# Altium footprint library Power_Lib_Altium.PcbLib: 383 footprints (part 7 of 24)
Each footprint in its own frame and in the unit in brackets; x right, y up, seen from the top. Pads: shape width x height; smd on the part's side, far side on the other; paste and mask are expansions set on the pad; w line width, h text height; cw(c..) or ccw(c..) is an arc to the next point about the centre after c.
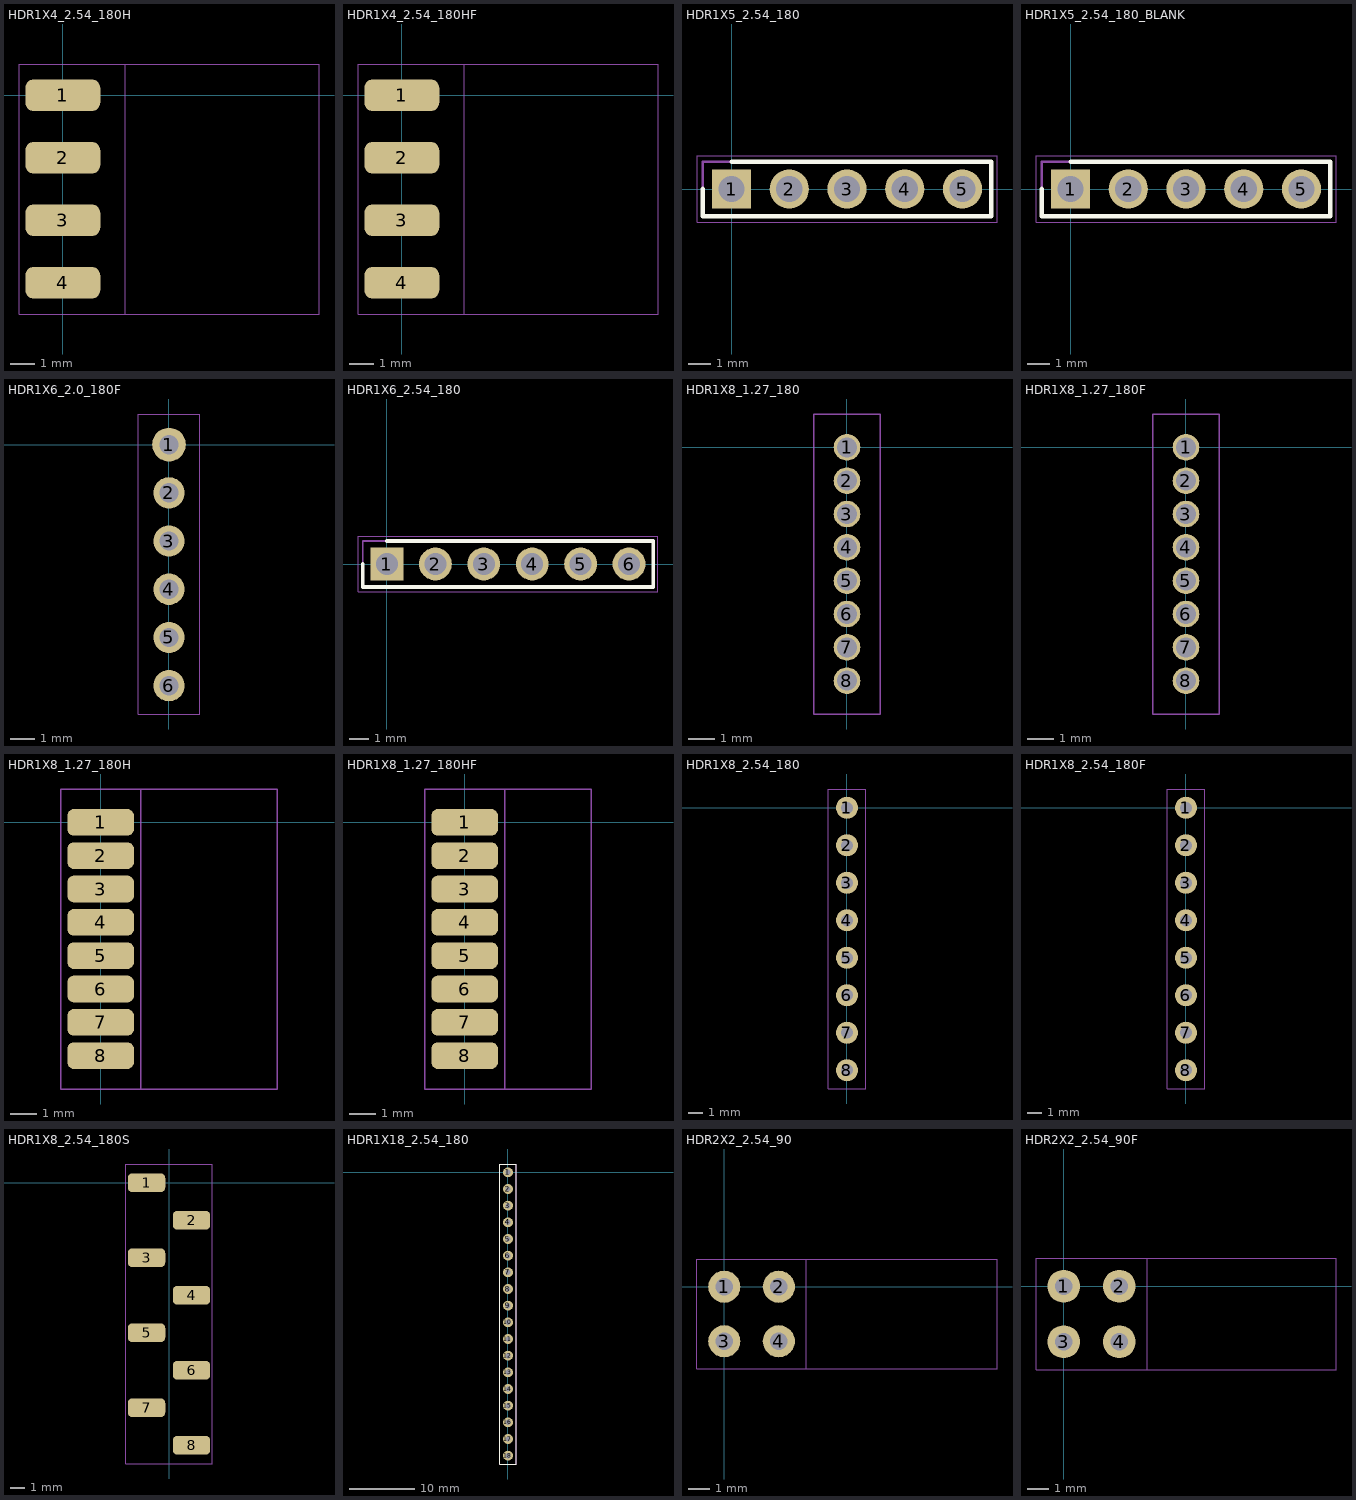
[diagram p6: the footprints below, top view; thin cyan lines are the x and y axes]

## HDR1X4_2.54_180H [mil]
height 169.29
pads (4):
  rrect50% 120x50 smd: 1(0,0) 2(0,-100) 3(0,-200) 4(0,-300)
Mechanical 13:
  lines w2: -70,-350 -70,50 410,50 410,-350 -70,-350
Mechanical 14:
  lines w2: -70,-350 100,-350 100,50 -70,50 -70,-350
3D body "pin_header_aw140-eg-g04d.stp": height 61.32, standoff -37.05, extent -35,-350 405.94,50

## HDR1X4_2.54_180HF [mil]
height 169.29
pads (4):
  rrect50% 120x50 smd: 1(0,0) 2(0,-100) 3(0,-200) 4(0,-300)
Mechanical 13:
  lines w2: -70,-350 410,-350 410,50 -70,50 -70,-350
Mechanical 14:
  lines w2: -70,-350 -70,50 100,50 100,-350 -70,-350

## HDR1X5_2.54_180 [mm]
pads (5):
  rect 1.725x1.725 hole 1.15: 1(0,0)
  round 1.725 hole 1.15: 2(2.54,0) 3(5.08,0) 4(7.62,0) 5(10.16,0)
Top Overlay:
  lines w0.2: -1.27,0 -1.27,-1.205 11.43,-1.205 11.43,1.205 0,1.205
Mechanical 13:
  lines w0.1: -1.27,-1.205 11.43,-1.205 11.43,1.205 -1.27,1.205 -1.27,-1.205
Mechanical 15:
  lines w0.05: -1.52,-1.455 11.68,-1.455 11.68,1.455 -1.52,1.455 -1.52,-1.455
3D body "10129378-905001BLF.stp": height 8.58, standoff -3.3, extent -1.27,-1.205 11.43,1.205

## HDR1X5_2.54_180_BLANK [mm]
pads (5):
  rect 1.725x1.725 hole 1.15: 1(0,0)
  round 1.725 hole 1.15: 2(2.54,0) 3(5.08,0) 4(7.62,0) 5(10.16,0)
Top Overlay:
  lines w0.2: -1.27,0 -1.27,-1.205 11.43,-1.205 11.43,1.205 0,1.205
Mechanical 13:
  lines w0.1: -1.27,-1.205 11.43,-1.205 11.43,1.205 -1.27,1.205 -1.27,-1.205
Mechanical 15:
  lines w0.05: -1.52,-1.455 11.68,-1.455 11.68,1.455 -1.52,1.455 -1.52,-1.455

## HDR1X6_2.0_180F [mm]
height 4.3
pads (6):
  round 1.4 hole 0.8: 1(0,0)
  round 1.3 hole 0.8: 2(0,-2) 3(0,-4) 4(0,-6) 5(0,-8) 6(0,-10)
Mechanical 13:
  lines w0.051: -1.27,-11.176 -1.27,1.27 1.27,1.27 1.27,-11.176 -1.27,-11.176
Mechanical 14:
  lines w0.051: -1.27,-11.176 -1.27,1.27 1.27,1.27 1.27,-11.176 -1.27,-11.176

## HDR1X6_2.54_180 [mm]
pads (6):
  rect 1.725x1.725 hole 1.15: 1(0,0)
  round 1.725 hole 1.15: 2(2.54,0) 3(5.08,0) 4(7.62,0) 5(10.16,0) 6(12.7,0)
Top Overlay:
  lines w0.2: -1.27,0 -1.27,-1.205 13.97,-1.205 13.97,1.205 0,1.205
Mechanical 13:
  lines w0.1: -1.27,-1.205 -1.27,1.205 13.97,1.205 13.97,-1.205 -1.27,-1.205
Mechanical 15:
  lines w0.05: -1.52,-1.455 -1.52,1.455 14.22,1.455 14.22,-1.455 -1.52,-1.455
3D body "10129378-906001BLF.stp": height 8.58, standoff -3.3, extent -1.27,-1.205 13.97,1.205

## HDR1X8_1.27_180 [mil]
height 169.29
pads (8):
  round 40 hole 30: 1(0,0) 2(0,-50) 3(0,-100) 4(0,-150) 5(0,-200) 6(0,-250) 7(0,-300) 8(0,-350)
Mechanical 13:
  lines w2: -50,-400 50,-400 50,50 -50,50 -50,-400
Mechanical 14:
  lines w2: -50,-400 50,-400 50,50 -50,50 -50,-400
3D body "pin_header_a-sl127-eg-z08d.stp": height 210.24, standoff -102.36, extent -49.21,-374.99 49.21,25.01

## HDR1X8_1.27_180F [mil]
height 169.29
pads (8):
  round 40 hole 30: 1(0,0) 2(0,-50) 3(0,-100) 4(0,-150) 5(0,-200) 6(0,-250) 7(0,-300) 8(0,-350)
Mechanical 13:
  lines w2: -50,-400 -50,50 50,50 50,-400 -50,-400
Mechanical 14:
  lines w2: -50,-400 -50,50 50,50 50,-400 -50,-400
3D body "female_header_a-bl127-eg-z08d.stp": height 133.86, standoff -94.49, extent -35.43,-382.88 35.43,32.87

## HDR1X8_1.27_180H [mil]
height 169.29
pads (8):
  rrect50% 100x40 smd: 1(0,0) 2(0,-50) 3(0,-100) 4(0,-150) 5(0,-200) 6(0,-250) 7(0,-300) 8(0,-350)
Mechanical 13:
  lines w2: -60,-400 265,-400 265,50 -60,50 -60,-400
Mechanical 14:
  lines w2: -60,-400 60,-400 60,50 -60,50 -60,-400
3D body "pin_header_a-sl127-eg-g08d.stp": height 49.21, standoff -49.21, extent -47.36,-375 265.24,25

## HDR1X8_1.27_180HF [mil]
height 169.29
pads (8):
  rrect50% 100x40 smd: 1(0,0) 2(0,-50) 3(0,-100) 4(0,-150) 5(0,-200) 6(0,-250) 7(0,-300) 8(0,-350)
Mechanical 13:
  lines w2: -60,-400 -60,50 190,50 190,-400 -60,-400
Mechanical 14:
  lines w2: -60,-400 -60,50 60,50 60,-400 -60,-400
3D body "female_header_a-bl127-eg-z08d.stp": height 71.43, standoff 0.57, extent -39.48,-382.88 188.87,32.87

## HDR1X8_2.54_180 [mm]
height 4.3
pads (8):
  round 1.5 hole 0.813: 1(0,0) 2(0,-2.54) 3(0,-5.08) 4(0,-7.62) 5(0,-10.16) 6(0,-12.7) 7(0,-15.24) 8(0,-17.78)
Mechanical 13:
  lines w0.051: -1.27,-19.05 1.27,-19.05 1.27,1.27 -1.27,1.27 -1.27,-19.05
Mechanical 14:
  lines w0.051: -1.27,-19.05 -1.27,1.27 1.27,1.27 1.27,-19.05 -1.27,-19.05
3D body "pin_header_aw140-eg-g08d.stp": height 8.2, standoff -3, extent -1.249,-19.05 1.249,1.27

## HDR1X8_2.54_180F [mm]
height 4.3
pads (8):
  round 1.5 hole 0.813: 1(0,0) 2(0,-2.54) 3(0,-5.08) 4(0,-7.62) 5(0,-10.16) 6(0,-12.7) 7(0,-15.24) 8(0,-17.78)
Mechanical 13:
  lines w0.051: -1.27,-19.05 -1.27,1.27 1.27,1.27 1.27,-19.05 -1.27,-19.05
Mechanical 14:
  lines w0.051: -1.27,-19.05 -1.27,1.27 1.27,1.27 1.27,-19.05 -1.27,-19.05
3D body "female_header_a-bl254-eg-g08d.stp": height 8.5, standoff -3.2, extent -1.25,-19.173 1.25,1.397

## HDR1X8_2.54_180S [mil]
height 169.29
pads (8):
  rrect50% 100x50 smd: 1(-60,0) 2(60,-100) 3(-60,-200) 4(60,-300) 5(-60,-400) 6(60,-500) 7(-60,-600) 8(60,-700)
Mechanical 13:
  lines w2: -115,-750 -115,50 115,50 115,-750 -115,-750
Mechanical 14:
  lines w2: -115,-750 115,-750 115,50 -115,50 -115,-750
3D body "pin_header_a-sl254-eg-g08mp1.stp": height 386.46, standoff -0.94, extent -98.56,-746.06 98.29,53.94

## HDR1X18_2.54_180 [mm]
height 4.3
pads (18):
  round 1.5 hole 0.813: 1(0,0) 2(0,-2.54) 3(0,-5.08) 4(0,-7.62) 5(0,-10.16) 6(0,-12.7) 7(0,-15.24) 8(0,-17.78) 9(0,-20.32) 10(0,-22.86) 11(0,-25.4) 12(0,-27.94) 13(0,-30.48) 14(0,-33.02) 15(0,-35.56) 16(0,-38.1) 17(0,-40.64) 18(0,-43.18)
Top Overlay:
  lines w0.051: -1.27,-44.45 1.27,-44.45 1.27,1.27 -1.27,1.27 -1.27,-44.45
Bottom Overlay:
  lines w0.051: -1.27,-44.45 1.27,-44.45 1.27,1.27 -1.27,1.27 -1.27,-44.45
Mechanical 13:
  lines w0.051: -1.27,-44.45 1.27,-44.45 1.27,1.27 -1.27,1.27 -1.27,-44.45
Mechanical 14:
  lines w0.051: -1.27,-44.45 -1.27,1.27 1.27,1.27 1.27,-44.45 -1.27,-44.45

## HDR2X2_2.54_90 [mm]
height 4.3
pads (4):
  round 1.5 hole 0.813: 1(0,0) 2(2.54,0) 3(0,-2.54) 4(2.54,-2.54)
Mechanical 13:
  lines w0.051: -1.27,-3.81 12.7,-3.81 12.7,1.27 -1.27,1.27 -1.27,-3.81
Mechanical 14:
  lines w0.051: -1.27,-3.81 3.81,-3.81 3.81,1.27 -1.27,1.27 -1.27,-3.81
3D body "pin_header_awl254-da-g04d.stp": height 5.04, standoff -2.96, extent -0.254,-3.81 12.626,1.27

## HDR2X2_2.54_90F [mm]
height 4.3
pads (4):
  round 1.5 hole 0.813: 1(0,0) 2(2.54,0) 3(0,-2.54) 4(2.54,-2.54)
Mechanical 13:
  lines w0.051: -1.27,-3.81 12.446,-3.81 12.446,1.27 -1.27,1.27 -1.27,-3.81
Mechanical 14:
  lines w0.051: -1.27,-3.81 -1.27,1.27 3.81,1.27 3.81,-3.81 -1.27,-3.81
3D body "female_header_a-bl254-da-g04d.stp": height 5.04, standoff -3.16, extent -0.254,-3.935 12.346,1.395